# Altium footprint library SMotlaq-PCB_lib.PcbLib: 186 footprints (part 9 of 12)
Each footprint in its own frame and in the unit in brackets; x right, y up, seen from the top. Pads: shape width x height; smd on the part's side, far side on the other; paste and mask are expansions set on the pad; w line width, h text height; cw(c..) or ccw(c..) is an arc to the next point about the centre after c.
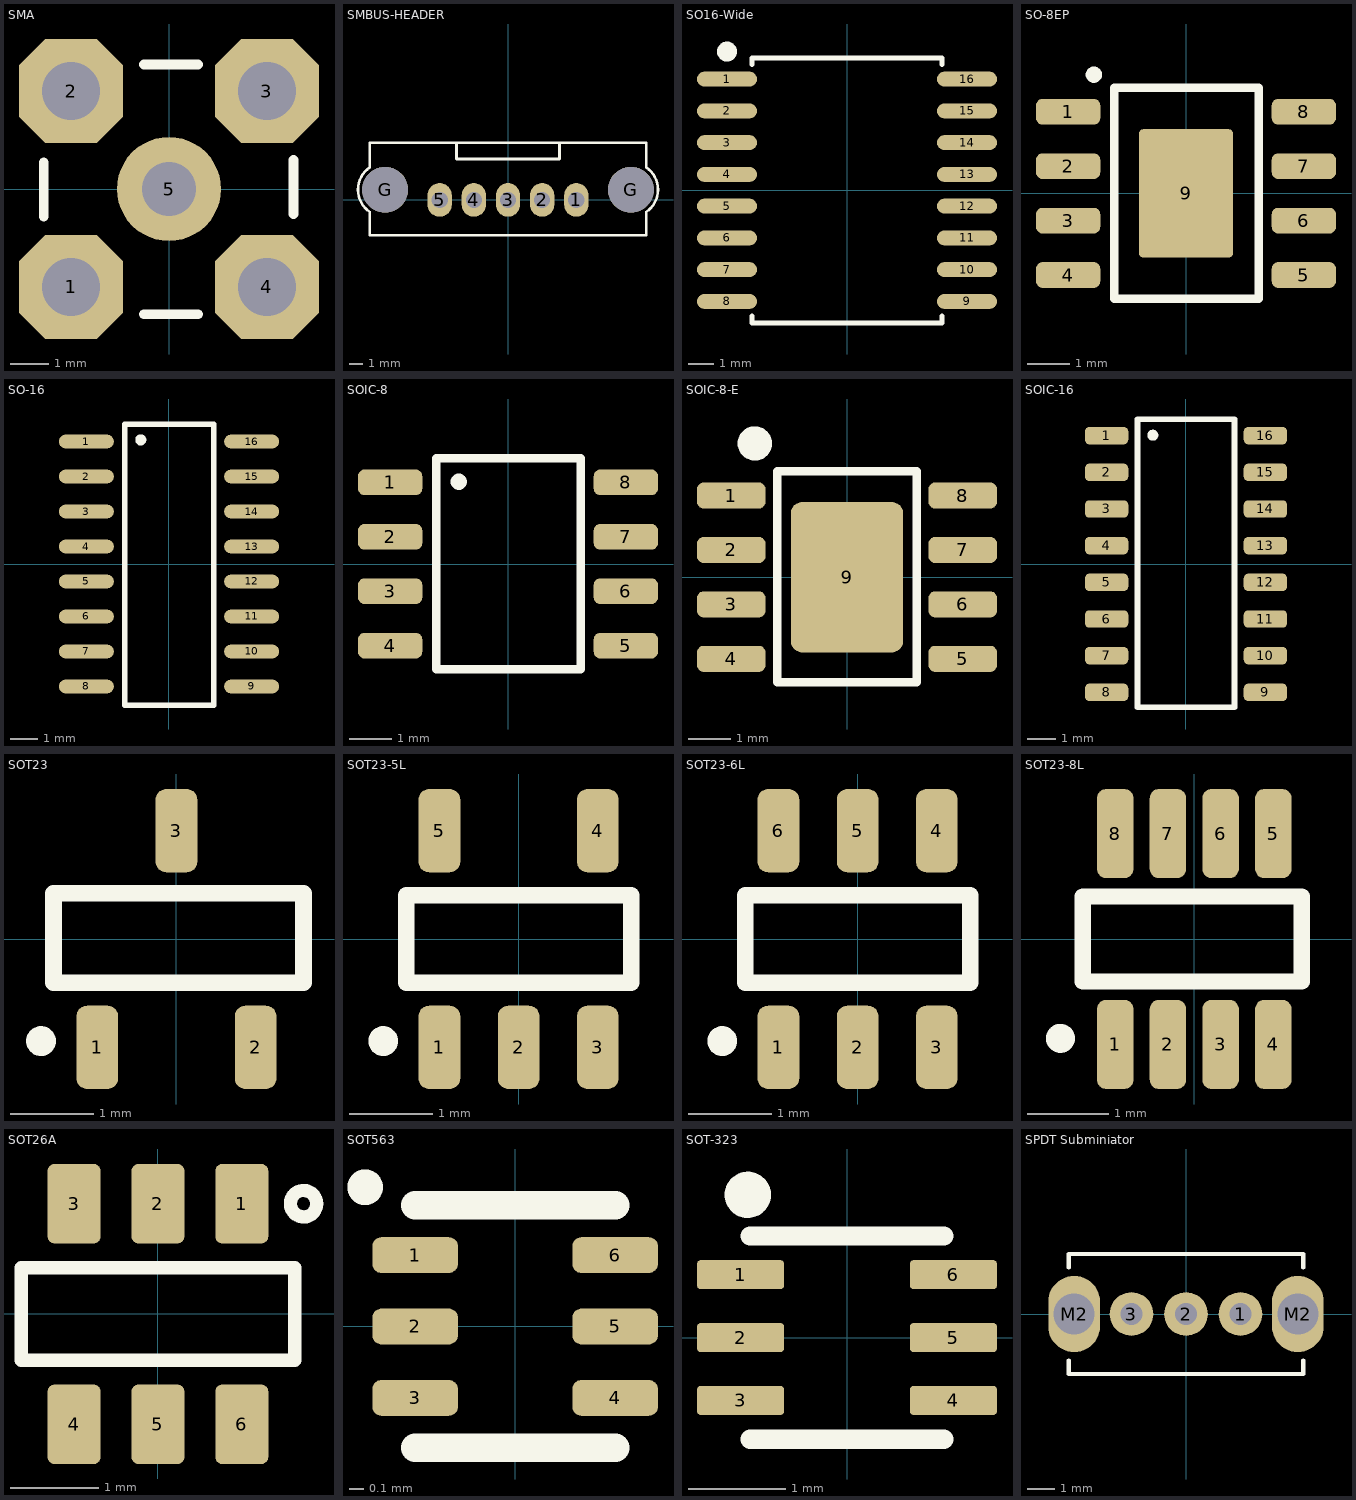
[diagram p8: the footprints below, top view; thin cyan lines are the x and y axes]

## SMA [mm]
pads (5):
  oct 2.7x2.7 hole 1.5 square: 1(-2.54,-2.54) 2(-2.54,2.54) 3(2.54,2.54) 4(2.54,-2.54)
  round 2.7 hole 1.4: 5(0,0)
Top Overlay:
  lines w0.254: -3.25,-0.71 -3.25,0.687 ; -0.647,-3.25 0.75,-3.25 ; -0.647,3.227 0.75,3.227 ; 3.227,-0.647 3.227,0.75
3D body "78m7270_5-1814832-1.stp": height 9.5, standoff -4, extent -3.2,-3.2 3.2,3.2

## SMBUS-HEADER [mm] "70541-0039"
height 11.43
pads (7):
  oval 1.8x2.5 hole 1.2 mask+0.1: 1(5.08,0) 2(2.54,0) 3(0,0) 4(-2.54,0) 5(-5.08,0)
  round 3.4 hole 3.4 unplated mask+0.1: G(-9.14,0.76) G(9.14,0.76)
Top Overlay:
  lines w0.2: -3.825,4.25 -3.825,3.05 0,3.05 3.825,3.05 3.825,4.25 ; -10.275,-2.625 10.275,-2.625 10.275,-0.905 ccw(c9.14,0.76) 10.275,2.425 10.275,4.25 -10.275,4.25 -10.275,2.425 ccw(c-9.14,0.76) -10.275,-0.905 -10.275,-2.625
3D body "0705410039.stp": height 11.81, standoff -3.81, extent -10.134,-2.525 10.084,4.079

## SO16-Wide [mm] "SOP, SOIC, 7.5mm width, 1.27mm pitch,"
pads (16):
  oval 2.4x0.6 smd: 1(-4.8,4.445) 2(-4.8,3.175) 3(-4.8,1.905) 4(-4.8,0.635) 5(-4.8,-0.635) 6(-4.8,-1.905) 7(-4.8,-3.175) 8(-4.8,-4.445) 9(4.8,-4.445) 10(4.8,-3.175) 11(4.8,-1.905) 12(4.8,-0.635) 13(4.8,0.635) 14(4.8,1.905) 15(4.8,3.175) 16(4.8,4.445)
Top Overlay:
  circle w0.4: c-4.8,5.55 r0.2
  lines w0.2: -3.8,-5.025 -3.8,-5.3 3.8,-5.3 3.8,-5.025 ; -3.8,5.025 -3.8,5.3 3.8,5.3 3.8,5.025
3D body "User Library-SOIC16_Wide_JEDEC_MS-013AA.step": height 2.62, standoff -0.03, extent -5.215,-5.25 5.415,5.25

## SO-8EP [mm]
pads (9):
  rrect50% 1.5x0.6 smd: 1(-2.75,1.905) 2(-2.75,0.635) 3(-2.75,-0.635) 4(-2.75,-1.905) 5(2.75,-1.905) 6(2.75,-0.635) 7(2.75,0.635) 8(2.75,1.905)
  rrect10% 2.2x3 smd: 9(0,0)
Top Overlay:
  circle w0.2: c-2.15,2.77 r0.09
  lines w0.2: -1.675,-2.455 1.7,-2.455 1.7,2.47 -1.675,2.47 -1.675,-2.455
3D body "User Library-so8-3.step": height 1.7, standoff 0, extent -2.975,-2.455 3.025,2.445

## SO-16 [mm]
pads (16):
  rrect100% 2x0.5 smd: 1(-3,4.445) 2(-3,3.175) 3(-3,1.905) 4(-3,0.635) 5(-3,-0.635) 6(-3,-1.905) 7(-3,-3.175) 8(-3,-4.445) 9(3,-4.445) 10(3,-3.175) 11(3,-1.905) 12(3,-0.635) 13(3,0.635) 14(3,1.905) 15(3,3.175) 16(3,4.445)
Top Overlay:
  circle w0.2: c-1.025,4.505 r0.1
  lines w0.2: -1.6,-5.12 1.625,-5.12 1.625,5.08 -1.6,5.08 -1.6,-5.12
3D body "User Library-so16.STEP": height 1.7, standoff 0, extent -3,-5.1 3,5.1

## SOIC-8 [mm]
pads (8):
  rrect50% 1.5x0.6 smd: 1(-2.75,1.905) 2(-2.75,0.635) 3(-2.75,-0.635) 4(-2.75,-1.905) 5(2.75,-1.905) 6(2.75,-0.635) 7(2.75,0.635) 8(2.75,1.905)
Top Overlay:
  circle w0.2: c-1.15,1.92 r0.09
  lines w0.2: -1.675,-2.455 1.7,-2.455 1.7,2.47 -1.675,2.47 -1.675,-2.455
3D body "User Library-so8-3.step": height 1.7, standoff 0, extent -2.975,-2.455 3.025,2.445

## SOIC-8-E [mm]
pads (9):
  rrect50% 1.6x0.61 smd: 1(-2.7,1.905) 2(-2.7,0.635) 3(-2.7,-0.635) 4(-2.7,-1.905) 5(2.7,-1.905) 6(2.7,-0.635) 7(2.7,0.635) 8(2.7,1.905)
  rrect20% 2.62x3.51 smd mask+0.075: 9(0,0)
Top Overlay:
  circle w0.4: c-2.15,3.12 r0.2
  lines w0.2: -1.625,-2.455 1.625,-2.455 1.625,2.47 -1.625,2.47 -1.625,-2.455
3D body "User Library-so8-3.step": height 1.7, standoff 0, extent -2.925,-2.455 3.075,2.445

## SOIC-16 [mm]
pads (16):
  rrect50% 1.5x0.6 smd: 1(-2.75,4.445) 2(-2.75,3.175) 3(-2.75,1.905) 4(-2.75,0.635) 5(-2.75,-0.635) 6(-2.75,-1.905) 7(-2.75,-3.175) 8(-2.75,-4.445) 9(2.75,-4.445) 10(2.75,-3.175) 11(2.75,-1.905) 12(2.75,-0.635) 13(2.75,0.635) 14(2.75,1.905) 15(2.75,3.175) 16(2.75,4.445)
Top Overlay:
  circle w0.2: c-1.15,4.46 r0.09
  lines w0.2: -1.675,-4.96 1.675,-4.96 1.675,5.01 -1.675,5.01 -1.675,-4.96
3D body "User Library-SOIC-16-1.step": height 1.4, standoff 0, extent -3,-4.95 3,4.95

## SOT23 [mm]
pads (3):
  rrect50% 0.5x1 smd: 1(-0.95,-1.3) 2(0.95,-1.3) 3(0,1.3)
Top Overlay:
  circle w0.2: c-1.625,-1.225 r0.079
  lines w0.2: -1.475,-0.525 1.525,-0.525 1.525,0.55 -1.475,0.55 -1.475,-0.525
3D body "CircuitWorks-SOT-23.step": height 1.08, standoff -0.01, extent -1.5,-1.25 1.5,1.25

## SOT23-5L [mm]
pads (5):
  rrect50% 0.5x1 smd: 1(-0.95,-1.3) 2(0,-1.3) 3(0.95,-1.3) 4(0.95,1.3) 5(-0.95,1.3)
Top Overlay:
  circle w0.2: c-1.625,-1.225 r0.079
  lines w0.2: -1.35,-0.525 -1.35,0.525 1.35,0.525 1.35,-0.525 -1.35,-0.525
3D body "CircuitWorks-SOT-23-5.step": height 1.08, standoff -0.02, extent -1.5,-1.25 1.5,1.25

## SOT23-6L [mm]
pads (6):
  rrect50% 0.5x1 smd: 1(-0.95,-1.3) 2(0,-1.3) 3(0.95,-1.3) 4(0.95,1.3) 5(0,1.3) 6(-0.95,1.3)
Top Overlay:
  circle w0.2: c-1.625,-1.225 r0.079
  lines w0.2: -1.35,-0.525 1.35,-0.525 1.35,0.525 -1.35,0.525 -1.35,-0.525
3D body "User Library-MO-178C.step": height 1.45, standoff 0, extent -1.45,-1.405 1.45,1.405

## SOT23-8L [mm]
pads (8):
  rrect50% 0.45x1.1 smd: 1(-0.975,-1.3) 2(-0.325,-1.3) 3(0.325,-1.3) 4(0.975,-1.3) 5(0.975,1.3) 6(0.325,1.3) 7(-0.325,1.3) 8(-0.975,1.3)
Top Overlay:
  circle w0.2: c-1.65,-1.225 r0.079
  lines w0.2: -1.375,-0.525 1.325,-0.525 1.325,0.525 -1.375,0.525 -1.375,-0.525
3D body "TMP422AMDCNTEP.stp": height 1.3, standoff 0, extent -1.475,-1.41 1.425,1.41

## SOT26A [mm]
pads (6):
  rrect25% 0.6x0.9 smd: 1(0.95,1.25) 2(0,1.25) 3(-0.95,1.25) 4(-0.95,-1.25) 5(0,-1.25) 6(0.95,-1.25)
Top Overlay:
  circle w0.15: c1.65,1.25 r0.15
  lines w0.15: -1.55,-0.525 -1.55,0.525 1.55,0.525 1.55,-0.525 -1.55,-0.525
3D body "User Library-ZXTC2045E6TA.step": height 1.4, standoff 0, extent -1.55,-1.5 1.55,1.5

## SOT563 [mm]
height 0.6
pads (6):
  rrect50% 0.6x0.25 smd mask+0.1: 1(-0.7,0.5) 2(-0.7,0) 3(-0.7,-0.5) 4(0.7,-0.5) 5(0.7,0) 6(0.7,0.5)
Top Overlay:
  circle w0.15: c-1.05,0.975 r0.05
  lines w0.2: -0.7,-0.85 0.7,-0.85 ; -0.7,0.85 0.7,0.85
3D body "User Library-SOT-563.step": height 0.58, standoff 0, extent -0.813,-0.8 0.813,0.8

## SOT-323 [mm]
height 1.1
pads (6):
  rrect25% 0.9x0.3 smd: 1(-1.1,0.65) 2(-1.1,0) 3(-1.1,-0.65) 4(1.1,-0.65) 5(1.1,0) 6(1.1,0.65)
Top Overlay:
  circle w0.254: c-1.025,1.475 r0.112
  lines w0.2: -1,-1.05 1,-1.05 ; -1,1.05 1,1.05
3D body "User Library-sot363.step": height 1, standoff 0, extent -1.15,-1.05 1.15,1.05

## SPDT Subminiator [mm] "Subminiator SPDT switch"
height 11.95
pads (5):
  round 1.6 hole 0.8: 1(2,0) 2(0,0) 3(-2,0)
  oval 1.9x2.8 hole 1.5: M2(-4.1,0) M2(4.1,0)
Top Overlay:
  lines w0.15: -4.3,-1.7 -4.3,-2.2 4.3,-2.2 4.3,-1.7 ; -4.3,1.7 -4.3,2.2 4.3,2.2 4.3,1.7
3D body "User Library-CK_Slide.step": height 4.7, standoff -2.79, extent -4.311,-2.28 4.3,6.093